# Altium footprint library 我的元件库01.PcbLib: 321 footprints (part 11 of 21)
Each footprint in its own frame and in the unit in brackets; x right, y up, seen from the top. Pads: shape width x height; smd on the part's side, far side on the other; paste and mask are expansions set on the pad; w line width, h text height; cw(c..) or ccw(c..) is an arc to the next point about the centre after c.
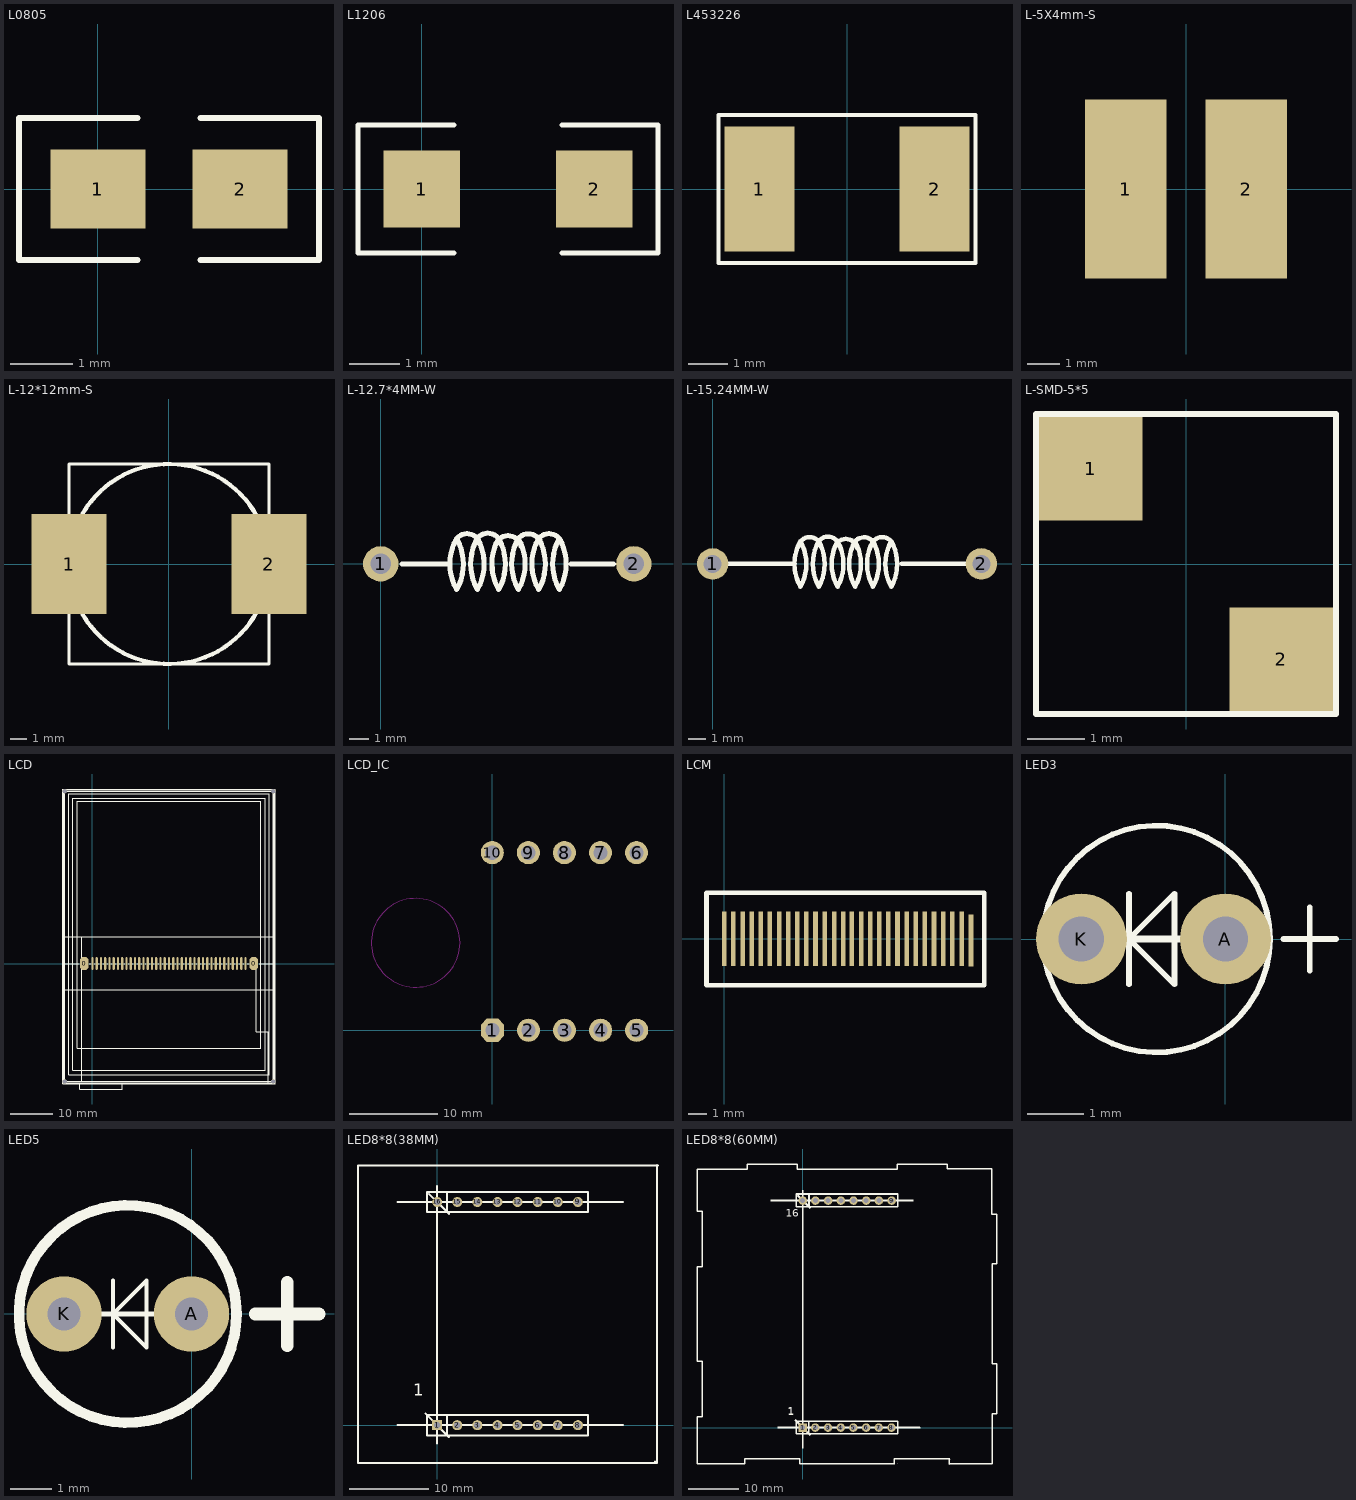
[diagram p10: the footprints below, top view; thin cyan lines are the x and y axes]

## L0805 [mil]
pads (2):
  rect 60x50 smd: 1(0,0) 2(90,0)
Top Overlay:
  lines w3.94: 25,-45 -50,-45 -50,45 25,45 ; 65,-45 140,-45 140,45 65,45
3D body "User Library-ind_0805.STEP": height 37.4, standoff 0, extent 5.63,-23.24 84.37,24

## L1206 [mil]
pads (2):
  rect 60x60 smd: 1(0,0) 2(135,0)
Top Overlay:
  lines w3.94: 25,-50 -50,-50 -50,50 25,50 ; 110,-50 185,-50 185,50 110,50
3D body "User Library-ind_1206.STEP": height 43.31, standoff 0, extent 5.01,-32 130.99,30.99

## L453226 [mm]
pads (2):
  rect 1.8x3.2 smd: 1(-2.25,0) 2(2.25,0)
Top Overlay:
  lines w0.1: -3.3,-1.9 -3.3,1.9 3.3,1.9 3.3,-1.9 -3.3,-1.9

## L-5X4mm-S [mm]
height 4.5
pads (2):
  rect 2.5x5.5 smd: 1(-1.85,0) 2(1.85,0)
3D body "电感.STEP": height 4.5, standoff -0.01, extent -2.857,-2.6 2.857,2.6

## L-12*12mm-S [mm]
height 6
pads (2):
  rect 4.5x6 smd: 1(-6,0) 2(6,0)
Top Overlay:
  circle w0.254: c0,0 r6
  lines w0.2: -6,-3 -6,-6 6,-6 6,-3 ; -6,3 -6,6 6,6 6,3
3D body "User Library-CDRH127-1.STEP": height 8, standoff -0.2, extent -6.051,-5.944 5.949,6.056

## L-12.7*4MM-W [mil]
height 196.85
pads (2):
  round 70 hole 40: 1(0,0) 2(500,0)
Top Overlay:
  lines w10: 41.9,0.1 137,0 ; 144.9,37.97 cw(c170.57,33.69) 196.12,38.6 ; 185.9,38.97 cw(c211.57,34.69) 237.12,39.6 ; 225.9,33.97 cw(c251.57,29.69) 277.12,34.6 ; 266.12,37.6 cw(c291.78,33.33) 317.33,38.24 ; 306.9,37.97 cw(c332.57,33.69) 358.12,38.6 ; 376,0 459.88,0.12 ; 149.86,50.46 cw(c59.12,-0.4) 150,-51 cw(c240.74,-0.15) 149.86,50.46 ; 190.86,50.46 ccw(c281.74,-0.15) 191,-51 ccw(c100.12,-0.4) 190.86,50.46 ; 232.86,50.46 ccw(c323.74,-0.15) 233,-51 ccw(c142.12,-0.4) 232.86,50.46 ; 271.86,50.46 ccw(c362.74,-0.15) 272,-51 ccw(c181.12,-0.4) 271.86,50.46 ; 311.86,50.46 ccw(c402.74,-0.15) 312,-51 ccw(c221.12,-0.4) 311.86,50.46 ; 352.86,50.46 cw(c262.12,-0.4) 353,-51 cw(c443.74,-0.15) 352.86,50.46
3D body "User Library-res_05x12_5.STEP": height 161.42, standoff -51.18, extent -9,-60 506.75,65.98

## L-15.24MM-W [mil]
height 196.85
pads (2):
  round 70 hole 40: 1(0,0) 2(600,0.11)
Top Overlay:
  lines w10: 0,0.19 183,0 ; 190.9,37.97 cw(c216.57,33.69) 242.12,38.6 ; 231.9,38.97 cw(c257.57,34.69) 283.12,39.6 ; 271.9,33.97 cw(c297.57,29.69) 323.12,34.6 ; 312.12,37.6 cw(c337.78,33.33) 363.33,38.24 ; 352.9,37.97 cw(c378.57,33.69) 404.12,38.6 ; 422,0 600,0.25 ; 195.86,50.46 ccw(c286.74,-0.15) 196,-51 ccw(c105.12,-0.4) 195.86,50.46 ; 236.86,50.46 cw(c146.12,-0.4) 237,-51 cw(c327.74,-0.15) 236.86,50.46 ; 278.86,50.46 cw(c188.12,-0.4) 279,-51 cw(c369.74,-0.15) 278.86,50.46 ; 317.86,50.46 cw(c227.12,-0.4) 318,-51 cw(c408.74,-0.15) 317.86,50.46 ; 357.86,50.46 cw(c267.12,-0.4) 358,-51 cw(c448.74,-0.15) 357.86,50.46 ; 398.86,50.46 ccw(c489.74,-0.15) 399,-51 ccw(c308.12,-0.4) 398.86,50.46
3D body "SW3dPS-Fair-Rite bead-on-lead, 1.5 turn.STEP": height 275.59, standoff -80.63, extent -12.06,-120.22 608.06,116

## L-SMD-5*5 [mm]
pads (2):
  rect 1.8x1.8 smd: 1(-1.651,1.651) 2(1.651,-1.651)
Top Overlay:
  lines w0.1: -2.6,-2.6 2.6,-2.6 2.6,2.6 -2.6,2.6 -2.6,-2.6

## LCD [mm]
pads (43):
  round 1 hole 1: 0(-6.52,-27.715) 0(-6.52,40.535) 0(42.52,-27.711) 0(42.52,40.538)
  oct 2x3 smd: 0(-1.901,0) 0(37.905,-0.003)
  oval 0.5x3 smd: 1(0,0) 2(1,0) 3(2,0) 4(3,0) 5(4,0) 6(5,0) 7(6,0) 8(7,0) 9(8,0) 10(9,0) 11(10,0) 12(11,0) 13(12,0) 14(13,0) 15(14,0) 16(15,0) 17(16,0) 18(17,0) 19(18,0) 20(19,0) 21(20,0) 22(21,0) 23(22,0) 24(23,0) 25(24,0) 26(25,0) 27(26,0) 28(27,0) 29(28,0) 30(29,0) 31(30,0) 32(31,0) 33(32,0) 34(33,0) 35(34,0) 36(35,0) 37(36,0)
Top Overlay:
  circle w0.254: c37.48,-0.5 r0.25
  circle w0.254: c-1.52,-0.5 r0.25
  lines w0.127: -6.52,0 -3.095,0 ; -0.809,0 -0.301,0 ; 0.389,-0.003 0.643,-0.003 ; 1.405,-0.003 1.633,-0.003 ; 2.395,-0.003 2.649,-0.003 ; 3.411,-0.003 3.64,-0.003 ; 4.351,-0.003 4.605,-0.003 ; 5.393,-0.003 5.621,-0.003 ; 6.358,-0.003 6.586,-0.003 ; 7.374,-0.003 7.628,-0.003 ; 8.364,-0.003 8.618,-0.003 ; 9.38,-0.003 9.634,-0.003 ; 10.371,-0.003 10.6,-0.003 ; 11.387,-0.003 11.641,-0.003 ; 12.378,-0.003 12.581,-0.003 ; 13.368,-0.003 13.597,-0.003 ; 14.333,-0.003 14.587,-0.003 ; 15.375,-0.003 15.603,-0.003 ; 16.365,-0.003 16.594,-0.003 ; 17.331,-0.003 17.559,-0.003 ; 18.321,-0.003 18.55,-0.003 ; 19.337,-0.003 19.591,-0.003 ; 20.328,-0.003 20.582,-0.003 ; 21.318,-0.003 21.598,-0.003 ; 22.36,-0.003 22.614,-0.003 ; 23.35,-0.003 23.604,-0.003 ; 24.341,-0.003 24.57,-0.003 ; 25.357,-0.003 25.56,-0.003 ; 26.322,-0.003 26.576,-0.003 ; 27.364,-0.003 27.592,-0.003 ; 28.354,-0.003 28.583,-0.003 ; 29.345,-0.003 29.599,-0.003 ; 30.335,-0.003 30.564,-0.003 ; 31.351,-0.003 31.605,-0.003 ; 32.367,-0.003 32.621,-0.003 ; 33.383,-0.003 33.612,-0.003 ; 34.374,-0.003 34.628,-0.003 ; 35.365,-0.003 35.593,-0.003 ; 36.381,-0.003 36.863,-0.003 ; 39.247,0 42.756,0
  lines w0.254: -6.8,40.335 -6.8,-27.995 42.8,-27.995 42.8,40.815 -6.8,40.815 ; -6.52,-6.175 42.654,-6.175 ; -6.52,6.285 42.756,6.285 ; -3,-28.215 -3,-29.5 7,-29.5 7,-28.215 ; -2.52,-27.816 -2.52,6.285 ; 38.48,0 38.48,-16 41.38,-16 41.38,-27.939 ; 43.02,41.035 -7.02,41.035 -7.02,-28.215 43.02,-28.215 43.02,41.038 ; -6.52,-27.715 42.52,-27.715 42.52,40.535 -6.52,40.535 -6.52,-27.715 ; -5.6,-26.165 -5.6,39.915 41.6,39.915 41.6,-26.165 -5.6,-26.165 ; -4.6,-25.065 40.6,-25.065 40.6,38.915 -4.6,38.915 -4.6,-25.065 ; -3.6,-19.865 39.6,-19.865 39.6,38.215 -3.6,38.215 -3.6,-19.865

## LCD_IC [mm]
pads (10):
  oct 2.6x2.6 hole 1.6: 1(0,0)
  round 2.6 hole 1.6: 2(4.064,0) 3(8.128,0) 4(12.192,0) 5(16.256,0) 6(16.242,20.014) 7(12.178,20.014) 8(8.114,20.014) 9(4.05,20.014) 10(-0.014,20.014)
Bottom Overlay:
  circle w0.1: c-8.65,9.854 r6.5
  lines w0.254: -2.586,-1.941 -2.586,22.259 -2.026,22.819 18.224,22.819 18.664,22.379 18.664,-1.881 18.294,-2.251 -2.276,-2.251 ; -2.564,-1.977 -2.31,-2.231
Keep-Out Layer:
  circle w0.1: c-8.65,9.854 r5

## LCM [mm]
pads (28):
  rect 0.25x3 smd: 1(0,0) 2(0.5,0) 3(1,0) 4(1.5,0) 5(2,0) 6(2.5,0) 7(3,0) 8(3.5,0) 9(4,0) 10(4.5,0) 11(5,0) 12(5.5,0) 13(6.032,0) 14(6.532,0) 15(7,0) 16(7.5,0) 17(8,0) 18(8.5,0) 19(9,0) 20(9.5,0) 21(10,0) 22(10.5,0) 23(11,0) 24(11.5,0) 25(12,0) 26(12.5,0) 27(13.032,0)
  rect 0.25x2.85 smd: 28(13.532,-0.083)
Top Overlay:
  lines w0.254: -0.976,-2.548 -0.976,2.532 14.264,2.532 14.264,-2.548 -0.976,-2.548

## LED3 [mm]
pads (2):
  round 1.6 hole 0.8: A(0,0) K(-2.54,0)
Top Overlay:
  circle w0.1: c-1.216,0 r2
  lines w0.1: -1.7,-0.8 -1.7,0 ; -1.7,0.8 -1.7,0 ; 1.024,0 1.948,0 ; 1.486,-0.562 1.486,0.562 ; -1.7,0 -0.9,0.8 -0.9,-0.8 -1.7,0
  lines w0.127: -1.7,0 -0.686,0
3D body "LED3_GRE.STEP": height 5.2, standoff -2, extent -3.241,-1.998 0.279,1.998

## LED5 [mm]
pads (2):
  round 1.8 hole 0.8: A(0,0) K(-3.048,0)
Top Overlay:
  circle w0.254: c-1.524,0 r2.6
  lines w0.1: -1.878,-0.8 -1.878,0 ; -1.878,0.8 -1.878,0 ; -1.878,0 -1.078,-0.8 -1.078,0.8 -1.878,0
  lines w0.127: -2.134,0 -0.889,0
  lines w0.305: 1.524,0 3.048,0 ; 2.286,-0.762 2.286,0.762
3D body "LED5_RED.STEP": height 8.6, standoff -2, extent -4.351,-2.905 0.999,2.794

## LED8*8(38MM) [mil]
pads (16):
  rect 50x50 hole 32: 1(0,0)
  round 50 hole 32: 2(100,0) 3(200,0) 4(300,0) 5(400,0) 6(500,0) 7(600,0) 8(700,0) 9(699.94,1110.29) 10(599.94,1110.29) 11(499.94,1110.29) 12(399.94,1110.29) 13(299.94,1110.29) 14(199.94,1110.29) 15(99.94,1110.29) 16(-0.06,1110.29)
Top Overlay:
  lines w10: -196.85,0 0,0 925.2,0 ; -196.85,1110.24 925.2,1110.24 ; -59.05,59.05 59.05,-59.05 ; -39.37,1149.61 59.05,1051.18 ; 0,-90.55 0,1110.24 0,1188.98 ; 49.95,1060.29 49.95,1160.29 ; 50,-50 50,50 ; 1082.68,-181.1 1086.61,-185.04 ; 1094.49,1295.28 1094.49,-188.98 -393.7,-188.98 -393.7,1291.34 1098.42,1291.34 ; -50.05,1060.29 -50.05,1160.29 749.95,1160.29 749.95,1060.29 -50.05,1060.29 ; -50,-50 -50,50 750,50 750,-50 -50,-50
  text "1" at -118.11,145.67 h60

## LED8*8(60MM) [mm]
pads (16):
  rect 1.7x1.7 hole 1: 1(0,0)
  round 1.7 hole 1: 2(2.54,0) 3(5.08,0) 4(7.62,0) 5(10.16,0) 6(12.7,0) 7(15.24,0) 8(17.78,0) 9(17.804,45.426) 10(15.264,45.426) 11(12.724,45.426) 12(10.184,45.426) 13(7.644,45.426) 14(5.104,45.426) 15(2.564,45.426) 16(0.024,45.426)
Top Overlay:
  lines w0.254: -20.129,12.734 -20.129,13.27 -21.115,13.27 -21.115,32.22 -20.143,32.22 -20.109,32.254 -20.109,32.74 -20.109,42.746 ; -20.115,42.752 -20.115,43.262 -21.129,43.262 -21.115,43.276 -21.115,51.734 -20.113,51.734 -11.117,51.734 -11.097,51.754 -11.097,52.724 -1.111,52.724 -1.111,51.754 -1.091,51.734 18.883,51.734 18.883,52.746 28.867,52.746 28.889,52.724 28.889,51.754 37.865,51.754 37.885,51.734 37.885,42.738 38.885,42.738 38.875,42.728 38.875,32.752 37.905,32.752 37.905,12.738 38.875,12.738 38.875,2.752 37.905,2.752 37.905,-7.23 37.881,-7.254 29.411,-7.254 29.385,-7.28 29.385,-6.28 29.399,-6.266 18.371,-6.266 18.371,-7.228 18.397,-7.254 -0.593,-7.254 -0.605,-7.266 -0.605,-6.28 -0.619,-6.266 -11.567,-6.266 -11.581,-6.28 -11.581,-7.266 -11.593,-7.254 -21.115,-7.254 -21.115,-6.262 -21.115,2.214 -20.129,2.214 -20.113,2.23 -20.113,2.732 -20.113,12.718 ; -20.113,42.742 -20.109,42.738 ; -6.381,45.487 22.119,45.487 ; -6.356,45.437 22.144,45.437 ; -5.025,0.05 -0.025,0.05 23.475,0.05 ; -5,0 0,0 23.5,0 ; -1.525,1.55 1.475,-1.45 ; -1.5,1.5 1.5,-1.5 ; -1,46.475 1.5,43.975 ; -0.975,46.425 1.525,43.925 ; 0,45.475 0,47.475 ; 0.019,-4.123 0.019,45.387 ; 0.025,45.425 0.025,47.425 ; 0.044,-4.173 0.044,45.337 ; 1.245,-1.22 1.245,1.32 ; 1.269,44.206 1.269,46.746 ; 1.27,-1.27 1.27,1.27 ; 1.294,44.156 1.294,46.696 ; 18.893,-7.266 18.905,-7.254 ; -1.295,-1.22 19.025,-1.22 19.025,1.32 -1.295,1.32 -1.295,-1.22 ; -1.271,44.206 19.049,44.206 19.049,46.746 -1.271,46.746 -1.271,44.206 ; -1.27,-1.27 19.05,-1.27 19.05,1.27 -1.27,1.27 -1.27,-1.27 ; -1.246,44.156 19.074,44.156 19.074,46.696 -1.246,46.696 -1.246,44.156
  text "1" at -3.025,2.55 h1.52
  text "1" at -3,2.5 h1.52
  text "16" at -3.387,42.232 h1.52

## Logo_USB [mm]
3D body "SW3dPS-USB Symbol.STEP": height 0.1, standoff 0, extent -5.529,-2.286 5.935,2.213